# Altium footprint library TYCO THD.PcbLib: 146 footprints (part 9 of 11) (continued)
## TYCO_2007456-1 [mm] "SFP+ 1x4 Press Fit Cage"
height 8.8
pads (23):
  rect 2.8x1.75 hole 1.05: 1(-18.09,28.5) 2(-9.09,28.5) 3(-0.09,28.5) 4(8.91,28.5) 5(19.61,28.5) 6(-22.59,9.5) 7(-13.59,9.5) 8(-4.59,9.5) 9(4.41,9.5) 10(15.11,9.5) 13(-18.09,-9.5) 14(-9.09,-9.5) 15(-0.09,-9.5) 16(8.91,-9.5) 17(19.61,-9.5) 19(-22.59,-28.5) 20(-13.59,-28.5) 21(-4.59,-28.5) 22(4.41,-28.5) 23(15.11,-28.5)
  rect 1.75x2.8 hole 1.05: 11(22.59,11.12) 12(22.59,-7.88) 18(22.59,-26.38)
Top Overlay:
  lines w0.2: -28.79,-29.999 -28.79,-5.6 -27.65,-5.295 -27.65,-3.405 -28.79,-3.1 -28.79,3.1 -27.65,3.405 -27.65,5.295 -28.79,5.6 -28.79,30 ; -28.79,-28.675 -26.565,-28.675 -26.565,-28.625 ; -28.79,-28.629 -23.99,-28.628 ; -28.79,-22.1 -28.79,-15.9 ; -28.79,28.625 -19.49,28.624 ; -28.79,28.675 -26.565,28.675 -26.565,28.625 ; -27.65,-28.675 -27.65,-30 -30.79,-30 -30.79,30 -27.65,30 -27.65,28.675 ; -24.49,28.625 -24.49,28.875 -19.99,28.875 -19.99,28.625 ; -21.19,-28.628 -14.99,-28.628 ; -20.64,-28.625 -20.64,-28.875 -15.54,-28.875 -15.54,-28.625 ; -16.69,28.624 -10.49,28.624 ; -15.44,28.625 -15.44,29.094 -11.74,29.094 -11.74,28.625 ; -12.19,-28.627 -5.99,-28.627 ; -10.94,-28.627 -10.94,-29.094 -7.24,-29.094 -7.24,-28.626 ; -7.69,28.623 -1.49,28.623 ; -6.44,28.625 -6.44,29.094 -2.74,29.094 -2.74,28.625 ; -3.19,-28.627 3.01,-28.626 ; -1.94,-28.627 -1.94,-29.094 1.76,-29.094 1.76,-28.626 ; 1.31,28.623 7.51,28.622 ; 1.86,28.625 1.86,28.875 6.96,28.875 6.96,28.625 ; 5.81,-28.626 13.71,-28.626 ; 6.31,-28.625 6.31,-28.875 8.41,-28.875 8.41,-28.625 ; 10.31,28.622 18.21,28.621 ; 16.51,-28.625 21.96,-28.625 21.96,-27.78 ; 18.21,28.675 17.91,28.675 17.91,28.925 18.21,28.925 ; 21.01,28.621 21.96,28.621 21.96,27.375 22.96,27.375 22.96,12.52 ; 21.01,28.675 21.96,28.675 cw(c21.96,28.175) 22.46,28.175 22.46,27.925 ; 21.01,28.925 21.96,28.925 cw(c21.96,28.175) 22.71,28.175 22.71,27.375 ; 21.96,-27.925 22.71,-27.925 ; 21.96,27.925 22.71,27.925 ; 22.46,-27.925 22.46,-28.175 cw(c21.96,-28.175) 21.96,-28.675 17.91,-28.675 17.91,-28.925 21.96,-28.925 ccw(c21.96,-28.175) 22.71,-28.175 22.71,-27.78 ; 22.71,-9.584 ccw(c22.506,-9.123) 22.985,-9.28 ; 22.71,-9.28 22.71,-10.625 22.96,-10.625 22.96,-24.98 ; 22.71,9.416 ccw(c22.506,9.877) 22.985,9.72 ; 22.71,9.72 22.71,8.375 22.96,8.375 22.96,-6.48 ; 22.96,-20.35 23.16,-20.35 23.16,-17.65 22.96,-17.65 ; 22.96,-1.35 23.16,-1.35 23.16,1.35 22.96,1.35 ; 22.96,17.65 23.16,17.65 23.16,20.35 22.96,20.35
Mechanical 8:
  drawing of 1062 lines, arcs and shapes, not listed
Mechanical 14:
  drawing of 885 lines, arcs and shapes, not listed
Drill Drawing:
  lines w0.1: -24.445,1.725 -24.445,22.37 -19.24,27.575 ; -27.65,-29.999 -27.65,30 23.16,30 23.16,-29.999 -27.65,-29.999
  text "PRESS-FIT TECHNOLOGY" at -26.255,3.6 h1
  text "23x diam. 1.05mm +/-0.05" at -24.87,1.625 h1
3D body "TYCO_2007456-1.stp": height 13.25, standoff -2.05, extent -30.79,-30 23.16,30

## TYCO_5103310-5 [mm] "20 Contacts - Right Angle Double-Row .100'' x .100'' Low Profile Four-Wall Header, AMP-LATCH Serie"
height 9.14
pads (20):
  round 1.7 hole 1: 1(-11.43,-1.27) 2(-11.43,1.27) 3(-8.89,-1.27) 4(-8.89,1.27) 5(-6.35,-1.27) 6(-6.35,1.27) 7(-3.81,-1.27) 8(-3.81,1.27) 9(-1.27,-1.27) 10(-1.27,1.27) 11(1.27,-1.27) 12(1.27,1.27) 13(3.81,-1.27) 14(3.81,1.27) 15(6.35,-1.27) 16(6.35,1.27) 17(8.89,-1.27) 18(8.89,1.27) 19(11.43,-1.27) 20(11.43,1.27)
Top Overlay:
  circle w0.3: c-13.2,-1.27 r0.15
  lines w0.2: -13.97,2.057 -12.7,4.257 -11.656,2.449 ; -12.336,2.057 -15.367,2.057 -15.367,1.016 -16.51,1.016 -16.51,10.871 16.51,10.871 16.51,1.016 15.367,1.016 15.367,2.057 12.336,2.057 ; -2.604,10.871 cw(c-2.604,10.363) -2.096,10.363 -2.095,4.14 ccw(c-1.333,4.14) -1.333,3.378 1.333,3.378 ccw(c1.333,4.14) 2.095,4.17 2.095,10.363 cw(c2.604,10.363) 2.604,10.871 ; -2.095,4.394 2.095,4.394 ; -1.581,4.394 -1.581,10.49 -0.959,10.49 -0.959,4.394 ; 0.959,4.394 0.959,10.49 1.581,10.49 1.581,4.394
  text "20" at 12.915,0.207 h1.2
Mechanical 8:
  lines w0.1: -11.93,-1.27 -11.43,-1.27 ; -11.93,1.27 -11.43,1.27 ; -11.43,-1.77 -11.43,-1.27 ; -11.43,-0.77 -11.43,-1.27 ; -11.43,0.77 -11.43,1.27 ; -11.43,1.77 -11.43,1.27 ; -10.93,-1.27 -11.43,-1.27 ; -10.93,1.27 -11.43,1.27 ; -9.39,-1.27 -8.89,-1.27 ; -9.39,1.27 -8.89,1.27 ; -8.89,-1.77 -8.89,-1.27 ; -8.89,-0.77 -8.89,-1.27 ; -8.89,0.77 -8.89,1.27 ; -8.89,1.77 -8.89,1.27 ; -8.39,-1.27 -8.89,-1.27 ; -8.39,1.27 -8.89,1.27 ; -6.85,-1.27 -6.35,-1.27 ; -6.85,1.27 -6.35,1.27 ; -6.35,-1.77 -6.35,-1.27 ; -6.35,-0.77 -6.35,-1.27 ; -6.35,0.77 -6.35,1.27 ; -6.35,1.77 -6.35,1.27 ; -5.85,-1.27 -6.35,-1.27 ; -5.85,1.27 -6.35,1.27 ; -4.31,-1.27 -3.81,-1.27 ; -4.31,1.27 -3.81,1.27 ; -3.81,-1.77 -3.81,-1.27 ; -3.81,-0.77 -3.81,-1.27 ; -3.81,0.77 -3.81,1.27 ; -3.81,1.77 -3.81,1.27 ; -3.31,-1.27 -3.81,-1.27 ; -3.31,1.27 -3.81,1.27 ; -1.77,-1.27 -1.27,-1.27 ; -1.77,1.27 -1.27,1.27 ; -1.27,-1.77 -1.27,-1.27 ; -1.27,-0.77 -1.27,-1.27 ; -1.27,0.77 -1.27,1.27 ; -1.27,1.77 -1.27,1.27 ; -0.77,-1.27 -1.27,-1.27 ; -0.77,1.27 -1.27,1.27 ; -0.5,0 0,0 ; 0,-0.5 0,0 ; 0,0.5 0,0 ; 0.5,0 0,0 ; 0.77,-1.27 1.27,-1.27 ; 0.77,1.27 1.27,1.27 ; 1.27,-1.77 1.27,-1.27 ; 1.27,-0.77 1.27,-1.27 ; 1.27,0.77 1.27,1.27 ; 1.27,1.77 1.27,1.27 ; 1.77,-1.27 1.27,-1.27 ; 1.77,1.27 1.27,1.27 ; 3.31,-1.27 3.81,-1.27 ; 3.31,1.27 3.81,1.27 ; 3.81,-1.77 3.81,-1.27 ; 3.81,-0.77 3.81,-1.27 ; 3.81,0.77 3.81,1.27 ; 3.81,1.77 3.81,1.27 ; 4.31,-1.27 3.81,-1.27 ; 4.31,1.27 3.81,1.27 ; 5.85,-1.27 6.35,-1.27 ; 5.85,1.27 6.35,1.27 ; 6.35,-1.77 6.35,-1.27 ; 6.35,-0.77 6.35,-1.27 ; 6.35,0.77 6.35,1.27 ; 6.35,1.77 6.35,1.27 ; 6.85,-1.27 6.35,-1.27 ; 6.85,1.27 6.35,1.27 ; 8.39,-1.27 8.89,-1.27 ; 8.39,1.27 8.89,1.27 ; 8.89,-1.77 8.89,-1.27 ; 8.89,-0.77 8.89,-1.27 ; 8.89,0.77 8.89,1.27 ; 8.89,1.77 8.89,1.27 ; 9.39,-1.27 8.89,-1.27 ; 9.39,1.27 8.89,1.27 ; 10.93,-1.27 11.43,-1.27 ; 10.93,1.27 11.43,1.27 ; 11.43,-1.77 11.43,-1.27 ; 11.43,-0.77 11.43,-1.27 ; 11.43,0.77 11.43,1.27 ; 11.43,1.77 11.43,1.27 ; 11.93,-1.27 11.43,-1.27 ; 11.93,1.27 11.43,1.27
Mechanical 14:
  circle w0.3: c-13.2,-1.27 r0.15
  lines w0.1: -13.97,2.057 -12.7,4.257 -11.43,2.057 ; -11.938,2.057 -11.938,1.676 -11.741,1.676 ; -11.741,2.057 -11.741,-1.581 -11.119,-1.581 -11.119,2.057 ; -11.119,1.676 -10.922,1.676 -10.922,2.057 ; -9.398,2.057 -9.398,1.676 -9.201,1.676 ; -9.201,2.057 -9.201,-1.581 -8.579,-1.581 -8.579,2.057 ; -8.579,1.676 -8.382,1.676 -8.382,2.057 ; -6.858,2.057 -6.858,1.676 -6.661,1.676 ; -6.661,2.057 -6.661,-1.581 -6.039,-1.581 -6.039,2.057 ; -6.039,1.676 -5.842,1.676 -5.842,2.057 ; -4.318,2.057 -4.318,1.676 -4.121,1.676 ; -4.121,2.057 -4.121,-1.581 -3.499,-1.581 -3.499,2.057 ; -3.499,1.676 -3.302,1.676 -3.302,2.057 ; -2.604,10.871 cw(c-2.604,10.363) -2.096,10.363 -2.095,4.14 ccw(c-1.333,4.14) -1.333,3.378 1.333,3.378 ccw(c1.333,4.14) 2.095,4.17 2.095,10.363 cw(c2.604,10.363) 2.604,10.871 ; -2.095,4.394 2.095,4.394 ; -1.778,2.057 -1.778,1.676 -1.581,1.676 ; -1.581,2.057 -1.581,-1.581 -0.959,-1.581 -0.959,2.057 ; -1.581,4.394 -1.581,10.49 -0.959,10.49 -0.959,4.394 ; -0.959,1.676 -0.762,1.676 -0.762,2.057 ; 0.762,2.057 0.762,1.676 0.959,1.676 ; 0.959,2.057 0.959,-1.581 1.581,-1.581 1.581,2.057 ; 0.959,4.394 0.959,10.49 1.581,10.49 1.581,4.394 ; 1.581,1.676 1.778,1.676 1.778,2.057 ; 3.302,2.057 3.302,1.676 3.499,1.676 ; 3.499,2.057 3.499,-1.581 4.121,-1.581 4.121,2.057 ; 4.121,1.676 4.318,1.676 4.318,2.057 ; 5.842,2.057 5.842,1.676 6.039,1.676 ; 6.039,2.057 6.039,-1.581 6.661,-1.581 6.661,2.057 ; 6.661,1.676 6.858,1.676 6.858,2.057 ; 8.382,2.057 8.382,1.676 8.579,1.676 ; 8.579,2.057 8.579,-1.581 9.201,-1.581 9.201,2.057 ; 9.201,1.676 9.398,1.676 9.398,2.057 ; 10.922,2.057 10.922,1.676 11.119,1.676 ; 11.119,2.057 11.119,-1.581 11.741,-1.581 11.741,2.057 ; 11.741,1.676 11.938,1.676 11.938,2.057 ; -16.51,1.016 -15.367,1.016 -15.367,2.057 15.367,2.057 15.367,1.016 16.51,1.016 16.51,10.871 -16.51,10.871 -16.51,1.016
  text "20" at 12.915,0.207 h1.2
3D body "TYCO_5103310-5.stp": height 9.14, standoff -3.43, extent -16.51,-1.581 16.51,10.871

## TYCO_5120913-1 [mm] "Universal Right Angle Female Power Module Guide (keyed)"
height 9.78
pads (4):
  round 5.2 hole 2.9: 1(-7.5,0) 1(0,0)
  rect 22.8x8.3 smd paste-4.15 mask-4.15: 1(1.25,0)
  round 3.9 hole 3.2: 1(7.5,0)
Top Overlay:
  lines w0.2: 13.05,-3.95 24.25,-3.95 24.25,3.95 13.05,3.95 ; 13.05,-3.25 24.25,-3.25 ; 13.05,3.25 24.25,3.25
Mechanical 8:
  circle w0.1: c0,0 r1.45
  circle w0.1: c7.5,0 r1.6
  circle w0.1: c-7.5,0 r1.45
  lines w0.1: -8,0 -7.5,0 ; -7.5,-0.5 -7.5,0 ; -7.5,0.5 -7.5,0 ; -7,0 -7.5,0 ; -0.5,0 0,0 ; 0,-0.5 0,0 ; 0,0.5 0,0 ; 0.5,0 0,0 ; 7,0 7.5,0 ; 7.5,-0.5 7.5,0 ; 7.5,0.5 7.5,0 ; 8,0 7.5,0 ; 13.25,-3.95 13.25,0 13.25,3.95
  text "PCB Edge" at 14.615,-3.5 h1
Mechanical 14:
  lines w0.1: 11.75,-3.95 11.75,-3.25 24.25,-3.25 ; 11.75,3.95 11.75,3.25 24.25,3.25 ; -9.95,-3.95 24.25,-3.95 24.25,3.95 -9.95,3.95 -9.95,-3.95
3D body "TYCO_5120913-1.stp": height 9.7, standoff -2, extent -9.95,-3.95 24.25,3.95

## TYCO_5227673-1 [mm] "50 Ohms , BNC Vertical Socket"
height 36.23
pads (4):
  round 1.6 hole 0.9: 1(0,0) 2(-2.54,0)
  round 2.8 hole 2.1: 3(-5.08,-5.08) 3(5.08,5.08)
Top Overlay:
  circle w0.2: c0,0 r4.064
  lines w0.2: -7.379,-2.825 -7.379,-6.604 ccw(c-6.363,-6.604) -6.363,-7.62 -1.949,-7.62 ; -7.379,2.905 -7.379,6.604 cw(c-6.363,6.604) -6.363,7.62 ; -7,-3.653 cw(c-0.017,0.04) -7,3.734 ; -6.737,4.193 cw(c-0.017,0.04) -0.253,7.937 ; -6.712,-4.208 -7,-4.041 -7,4.041 0,8.083 3.509,6.057 ccw(c0,0) -6.057,-3.509 ; -4.161,-6.686 ccw(c-0.017,0.04) -0.403,-7.85 ; -3.492,7.62 -3.492,8.255 -6.858,8.255 -6.858,7.62 -6.363,7.62 ; -2.243,7.62 -6.363,7.62 ; -2.061,-1.1 ccw(c0,0) -2.061,1.1 ; -0.991,-4.723 -0.991,-5.537 0.984,-5.537 0.991,-4.723 ; -0.991,4.723 -0.991,5.486 0.991,5.486 0.991,4.723 ; 0.255,7.935 cw(c-0.017,0.04) 4.212,6.713 ; 0.406,-7.849 ccw(c-0.017,0.04) 6.604,-4.27 ; 1.915,-7.62 6.363,-7.62 ccw(c6.363,-6.604) 7.379,-6.604 7.379,-2.738 ; 2.209,7.62 6.363,7.62 cw(c6.363,6.604) 7.379,6.604 7.379,2.818 ; 3.302,7.62 3.302,8.255 6.858,8.255 6.858,7.491 ; 6.057,3.509 cw(c0,0) -3.509,-6.057 0,-8.083 7,-4.041 7,4.041 6.712,4.208 ; 7,-3.59 ccw(c-0.017,0.04) 7,3.67 ; 4.712,-1.044 cw(c0,0) 4.712,1.044 4.712,-1.044
Mechanical 8:
  lines w0.1: -5.58,-5.08 -5.08,-5.08 ; -5.08,-5.58 -5.08,-5.08 ; -5.08,-4.58 -5.08,-5.08 ; -4.58,-5.08 -5.08,-5.08 ; -3.04,0 -2.54,0 ; -2.54,-0.5 -2.54,0 ; -2.54,0.5 -2.54,0 ; -2.04,0 -2.54,0 ; -0.5,0 0,0 ; 0,-0.5 0,0 ; 0,0.5 0,0 ; 0.5,0 0,0 ; 4.58,5.08 5.08,5.08 ; 5.08,4.58 5.08,5.08 ; 5.08,5.58 5.08,5.08 ; 5.58,5.08 5.08,5.08
Mechanical 14:
  circle w0.1: c0,0 r7
  circle w0.1: c0,0 r4.064
  circle w0.1: c0,0 r1.041
  circle w0.1: c0,0 r0.508
  circle w0.1: c0,0 r2.337
  lines w0.1: -7.379,-2.825 -7.379,-6.604 ccw(c-6.363,-6.604) -6.363,-7.62 -1.949,-7.62 ; -7.379,2.905 -7.379,6.604 cw(c-6.363,6.604) -6.363,7.62 ; -7,-3.653 cw(c-0.017,0.04) -7,3.734 ; -6.737,4.193 cw(c-0.017,0.04) -0.253,7.937 ; -6.657,-4.239 ccw(c-0.017,0.04) -0.403,-7.85 ; -3.492,7.62 -3.492,8.255 -6.858,8.255 -6.858,7.62 -6.363,7.62 ; -2.243,7.62 -6.363,7.62 ; -0.991,-4.723 -0.991,-5.537 0.984,-5.537 0.991,-4.723 ; -0.991,4.723 -0.991,5.486 0.991,5.486 0.991,4.723 ; 0.255,7.935 cw(c-0.017,0.04) 6.685,4.223 ; 0.406,-7.849 ccw(c-0.017,0.04) 6.604,-4.27 ; 1.915,-7.62 6.363,-7.62 ccw(c6.363,-6.604) 7.379,-6.604 7.379,-2.738 ; 2.209,7.62 6.363,7.62 cw(c6.363,6.604) 7.379,6.604 7.379,2.818 ; 3.302,7.62 3.302,8.255 6.858,8.255 6.858,7.491 ; 7,-3.59 ccw(c-0.017,0.04) 7,3.67 ; -7,-4.041 -7,4.041 0,8.083 7,4.041 7,-4.041 0,-8.083 -7,-4.041 ; 4.712,-1.044 cw(c0,0) 4.712,1.044 4.712,-1.044
3D body "TYCO_5227673-1_Part3.stp": height 19.93, standoff 19.16, extent -7.916,-7.86 7.883,7.94
3D body "TYCO_5227673-1_Part2.stp": height 22.43, standoff 19.93, extent -7,-8.083 7,8.083
3D body "TYCO_5227673-1_Part1.stp": height 35.56, standoff -5.71, extent -7.379,-7.62 7.379,8.255

## TYCO_5352406-1 [mm] "Z-Pack, HM Type B19, 95 Contacts (abcde), Pitch 2mm, Male Right Angled Connector"
height 7.3
pads (95):
  round 1.1 hole 0.6: a1(0,0) a2(0,-2) a3(0,-4) a4(0,-6) a5(0,-8) a6(0,-10) a7(0,-12) a8(0,-14) a9(0,-16) a10(0,-18) a11(0,-20) a12(0,-22) a13(0,-24) a14(0,-26) a15(0,-28) a16(0,-30) a17(0,-32) a18(0,-34) a19(0,-36) b1(2,0) b2(2,-2) b3(2,-4) b4(2,-6) b5(2,-8) b6(2,-10) b7(2,-12) b8(2,-14) b9(2,-16) b10(2,-18) b11(2,-20) b12(2,-22) b13(2,-24) b14(2,-26) b15(2,-28) b16(2,-30) b17(2,-32) b18(2,-34) b19(2,-36) c1(4,0) c2(4,-2) c3(4,-4) c4(4,-6) c5(4,-8) c6(4,-10) c7(4,-12) c8(4,-14) c9(4,-16) c10(4,-18) c11(4,-20) c12(4,-22) c13(4,-24) c14(4,-26) c15(4,-28) c16(4,-30) c17(4,-32) c18(4,-34) c19(4,-36) d1(6,0) d2(6,-2) d3(6,-4) d4(6,-6) d5(6,-8) d6(6,-10) d7(6,-12) d8(6,-14) d9(6,-16) d10(6,-18) d11(6,-20) d12(6,-22) d13(6,-24) d14(6,-26) d15(6,-28) d16(6,-30) d17(6,-32) d18(6,-34) d19(6,-36) e1(8,0) e2(8,-2) e3(8,-4) e4(8,-6) e5(8,-8) e6(8,-10) e7(8,-12) e8(8,-14) e9(8,-16) e10(8,-18) e11(8,-20) e12(8,-22) e13(8,-24) e14(8,-26) e15(8,-28) e16(8,-30) e17(8,-32) e18(8,-34) e19(8,-36)
Top Overlay:
  lines w0.2: -2,-36.9 8.988,-36.9 9.4,-36.75 9.4,0.9 8.988,1.05 -2,1.05 -2,-36.95 -17.35,-36.95 -17.35,0.95 -2,0.95
  text "a" at -0.333,1.667 h1.2
  text "b" at 1.667,1.5 h1.2
  text "c" at 3.667,1.667 h1.2
  text "d" at 5.667,1.5 h1.2
  text "1" at -2.86,-0.8 h1.2
  text "19" at -4.16,-36.5 h1.2
  text "e" at 7.667,1.667 h1.2
Mechanical 8:
  lines w0.05: -1.5,-38.044 -1.5,2 ; -0.5,-36 0,-36 ; -0.5,-34 0,-34 ; -0.5,-2 0,-2 ; -0.5,0 0,0 ; 0,-36.5 0,-36 ; 0,-35.5 0,-36 ; 0,-34.5 0,-34 ; 0,-33.5 0,-34 ; 0,-2.5 0,-2 ; 0,-1.5 0,-2 ; 0,-0.5 0,0 ; 0,0.5 0,0 ; 0.5,-36 0,-36 ; 0.5,-34 0,-34 ; 0.5,-2 0,-2 ; 0.5,0 0,0 ; 1.5,-36 2,-36 ; 1.5,-34 2,-34 ; 1.5,-2 2,-2 ; 1.5,0 2,0 ; 2,-36.5 2,-36 ; 2,-35.5 2,-36 ; 2,-34.5 2,-34 ; 2,-33.5 2,-34 ; 2,-2.5 2,-2 ; 2,-1.5 2,-2 ; 2,-0.5 2,0 ; 2,0.5 2,0 ; 2.5,-36 2,-36 ; 2.5,-34 2,-34 ; 2.5,-2 2,-2 ; 2.5,0 2,0 ; 3.5,-36 4,-36 ; 3.5,-34 4,-34 ; 3.5,-2 4,-2 ; 3.5,0 4,0 ; 4,-36.5 4,-36 ; 4,-35.5 4,-36 ; 4,-34.5 4,-34 ; 4,-33.5 4,-34 ; 4,-2.5 4,-2 ; 4,-1.5 4,-2 ; 4,-0.5 4,0 ; 4,0.5 4,0 ; 4.5,-36 4,-36 ; 4.5,-34 4,-34 ; 4.5,-2 4,-2 ; 4.5,0 4,0 ; 5.5,-36 6,-36 ; 5.5,-34 6,-34 ; 5.5,-2 6,-2 ; 5.5,0 6,0 ; 6,-36.5 6,-36 ; 6,-35.5 6,-36 ; 6,-34.5 6,-34 ; 6,-33.5 6,-34 ; 6,-2.5 6,-2 ; 6,-1.5 6,-2 ; 6,-0.5 6,0 ; 6,0.5 6,0 ; 6.5,-36 6,-36 ; 6.5,-34 6,-34 ; 6.5,-2 6,-2 ; 6.5,0 6,0 ; 7.5,-36 8,-36 ; 7.5,-34 8,-34 ; 7.5,-2 8,-2 ; 7.5,0 8,0 ; 8,-36.5 8,-36 ; 8,-35.5 8,-36 ; 8,-34.5 8,-34 ; 8,-33.5 8,-34 ; 8,-2.5 8,-2 ; 8,-1.5 8,-2 ; 8,-0.5 8,0 ; 8,0.5 8,0 ; 8.5,-36 8,-36 ; 8.5,-34 8,-34 ; 8.5,-2 8,-2 ; 8.5,0 8,0
Mechanical 14:
  circle w0.1: c6,-2 r0.3
  circle w0.1: c8,-36 r0.3
  circle w0.1: c8,0 r0.3
  circle w0.1: c6,-36 r0.3
  circle w0.1: c6,0 r0.3
  circle w0.1: c4,-36 r0.3
  circle w0.1: c4,0 r0.3
  circle w0.1: c2,-36 r0.3
  circle w0.1: c2,0 r0.3
  circle w0.1: c8,-34 r0.3
  circle w0.1: c4,-34 r0.3
  circle w0.1: c2,-34 r0.3
  circle w0.1: c6,-34 r0.3
  circle w0.1: c0,-36 r0.3
  circle w0.1: c8,-2 r0.3
  circle w0.1: c0,-34 r0.3
  circle w0.1: c4,-2 r0.3
  circle w0.1: c0,-2 r0.3
  circle w0.1: c2,-2 r0.3
  circle w0.1: c0,0 r0.3
  lines w0.1: -2,-36.9 8.988,-36.9 9.4,-36.75 9.4,0.9 8.988,1.05 -2,1.05 -2,-36.95 -17.35,-36.95 -17.35,0.95 -2,0.95
  text "1" at -2.86,-0.8 h1.2
  text "d" at 5.667,1.5 h1.2
  text "c" at 3.667,1.667 h1.2
  text "b" at 1.667,1.5 h1.2
  text "a" at -0.333,1.667 h1.2
  text "19" at -4.16,-36.5 h1.2
  text "e" at 7.667,1.667 h1.2
Drill Drawing:
  lines w0.1: -1,-37 -1,1 ; 9,-37 9,1
  text "PRESS-FIT TECHNOLOGY diam. 0.6mm +/- 0.05" at 11,-34.9 h1
3D body "TYCO_5352406-1.stp": height 9.6, standoff -5.75, extent -17.35,-36.95 9.4,1.05

## TYCO_5406203-3 [mm] "4 x RJ45 Jacks - 8 Positions"
height 13.64
pads (39):
  round 1.6 hole 0.9: 1A(-16.51,1.27) 1B(-2.54,1.27) 1C(11.43,1.27) 1D(25.4,1.27) 2A(-17.78,-1.27) 2B(-3.81,-1.27) 2C(10.16,-1.27) 2D(24.13,-1.27) 3A(-19.05,1.27) 3B(-5.08,1.27) 3C(8.89,1.27) 3D(22.86,1.27) 4A(-20.32,-1.27) 4B(-6.35,-1.27) 4C(7.62,-1.27) 4D(21.59,-1.27) 5A(-21.59,1.27) 5B(-7.62,1.27) 5C(6.35,1.27) 5D(20.32,1.27) 6A(-22.86,-1.27) 6B(-8.89,-1.27) 6C(5.08,-1.27) 6D(19.05,-1.27) 7A(-24.13,1.27) 7B(-10.16,1.27) 7C(3.81,1.27) 7D(17.78,1.27) 8A(-25.4,-1.27) 8B(-11.43,-1.27) 8C(2.54,-1.27) 8D(16.51,-1.27)
  round 0.5 hole 3.2 unplated mask+1.35: M1(26.67,7.62) M2(-26.67,7.62)
  round 2.3 hole 1.6: SH(-29.46,12.19) SH(-13.97,-2.792) SH(0,-2.792) SH(13.97,-2.792) SH(29.46,12.19)
Top Overlay:
  lines w0.2: -30.12,13.402 -30.505,15.499 -30.505,16.896 cw(c-29.845,16.946) -30.183,17.516 -29.591,17.93 ; -29.894,13.548 -30.256,15.499 -30.256,16.896 cw(c-29.757,16.9) -30.04,17.312 -29.591,17.626 ; -29.591,10.7 -29.591,0.894 -29.274,0.645 -29.274,0.513 -29.459,0.513 -29.459,-2.916 -15.4,-2.916 ; -29.591,13.616 -29.591,18.42 29.591,18.42 29.591,13.616 ; -29.459,-1.039 -29.68,-0.625 -29.68,-0.117 -29.459,-0.117 ; -29.21,-2.916 -29.21,0.513 ; -25.349,18.42 -25.349,10.165 -24.841,10.165 -24.841,18.014 -22.301,18.014 -22.301,10.165 -21.793,10.165 -21.793,18.42 ; -20.142,18.42 -20.142,10.165 -19.634,10.165 -19.634,18.014 -17.094,18.014 -17.094,10.165 -16.586,10.165 -16.586,18.42 ; -12.5,-2.916 -1.4,-2.916 ; -11.379,18.42 -11.379,10.165 -10.871,10.165 -10.871,18.014 -8.331,18.014 -8.331,10.165 -7.823,10.165 -7.823,18.42 ; -6.172,18.42 -6.172,10.165 -5.664,10.165 -5.664,18.014 -3.124,18.014 -3.124,10.165 -2.616,10.165 -2.616,18.42 ; 1.4,-2.916 12.6,-2.916 ; 2.592,18.42 2.592,10.165 3.1,10.165 3.1,18.014 5.64,18.014 5.64,10.165 6.148,10.165 6.148,18.42 ; 7.799,18.42 7.799,10.165 8.307,10.165 8.307,18.014 10.847,18.014 10.847,10.165 11.355,10.165 11.355,18.42 ; 15.4,-2.916 29.459,-2.916 29.459,0.513 29.274,0.513 29.274,0.645 29.591,0.894 29.591,10.7 ; 16.562,18.42 16.562,10.165 17.07,10.165 17.07,18.014 19.61,18.014 19.61,10.165 20.118,10.165 20.118,18.42 ; 21.769,18.42 21.769,10.165 22.277,10.165 22.277,18.014 24.817,18.014 24.817,10.165 25.325,10.165 25.325,18.42 ; 29.21,-2.916 29.21,0.513 ; 29.459,-1.039 29.68,-0.625 29.68,-0.117 29.459,-0.117 ; 29.591,17.626 30.04,17.312 cw(c29.757,16.9) 30.256,16.896 30.256,15.499 29.894,13.548 ; 29.591,17.93 30.183,17.516 cw(c29.845,16.946) 30.505,16.896 30.505,15.499 30.12,13.402
Mechanical 8:
  drawing of 156 lines, arcs and shapes, not listed
Mechanical 14:
  lines w0.1: -29.591,10.526 -30.505,15.499 -30.505,16.896 cw(c-29.845,16.946) -30.183,17.516 -29.591,17.93 ; -29.591,11.914 -30.256,15.499 -30.256,16.896 cw(c-29.757,16.9) -30.04,17.312 -29.591,17.626 ; -29.459,-1.039 -29.68,-0.625 -29.68,-0.117 -29.459,-0.117 ; -29.21,-2.916 -29.21,0.513 29.21,0.513 29.21,-2.916 ; -25.349,18.42 -25.349,10.165 -24.841,10.165 -24.841,18.014 -22.301,18.014 -22.301,10.165 -21.793,10.165 -21.793,18.42 ; -20.142,18.42 -20.142,10.165 -19.634,10.165 -19.634,18.014 -17.094,18.014 -17.094,10.165 -16.586,10.165 -16.586,18.42 ; -11.379,18.42 -11.379,10.165 -10.871,10.165 -10.871,18.014 -8.331,18.014 -8.331,10.165 -7.823,10.165 -7.823,18.42 ; -6.172,18.42 -6.172,10.165 -5.664,10.165 -5.664,18.014 -3.124,18.014 -3.124,10.165 -2.616,10.165 -2.616,18.42 ; 2.592,18.42 2.592,10.165 3.1,10.165 3.1,18.014 5.64,18.014 5.64,10.165 6.148,10.165 6.148,18.42 ; 7.799,18.42 7.799,10.165 8.307,10.165 8.307,18.014 10.847,18.014 10.847,10.165 11.355,10.165 11.355,18.42 ; 16.562,18.42 16.562,10.165 17.07,10.165 17.07,18.014 19.61,18.014 19.61,10.165 20.118,10.165 20.118,18.42 ; 21.769,18.42 21.769,10.165 22.277,10.165 22.277,18.014 24.817,18.014 24.817,10.165 25.325,10.165 25.325,18.42 ; 29.459,-1.039 29.68,-0.625 29.68,-0.117 29.459,-0.117 ; 29.591,10.526 30.505,15.499 30.505,16.896 ccw(c29.845,16.946) 30.183,17.516 29.591,17.93 ; 29.591,11.914 30.256,15.499 30.256,16.896 ccw(c29.757,16.9) 30.04,17.312 29.591,17.626 ; -29.591,0.894 29.591,0.894 ; -29.591,0.894 -29.591,18.42 29.591,18.42 29.591,0.894 ; -29.591,0.894 -29.274,0.645 ; -29.274,0.645 29.274,0.645 ; -29.274,0.645 -29.274,0.513 -29.459,0.513 -29.459,-2.916 29.459,-2.916 29.459,0.513 29.274,0.513 29.274,0.645 ; 29.274,0.645 29.591,0.894
Mechanical 15:
  lines w0.1: -0.25,0 0,0 ; 0,-0.25 0,0 ; 0,0.25 0,0 ; 0.25,0 0,0
3D body "TYCO_5406203-3.stp": height 14.55, standoff -3.94, extent -30.505,-2.916 30.505,18.42

## TYCO_5530843-5 [mm] "50 Contacts, Pitch 2.54, 2rows,  Surface Mount Straight Receptacle, SEC-II Series"
height 15.5
pads (50):
  round 2 hole 1.3: 1(-30.48,-2.426) 2(-30.48,2.426) 3(-27.94,-2.426) 4(-27.94,2.426) 5(-25.4,-2.426) 6(-25.4,2.426) 7(-22.86,-2.426) 8(-22.86,2.426) 9(-20.32,-2.426) 10(-20.32,2.426) 11(-17.78,-2.426) 12(-17.78,2.426) 13(-15.24,-2.426) 14(-15.24,2.426) 15(-12.7,-2.426) 16(-12.7,2.426) 17(-10.16,-2.426) 18(-10.16,2.426) 19(-7.62,-2.426) 20(-7.62,2.426) 21(-5.08,-2.426) 22(-5.08,2.426) 23(-2.54,-2.426) 24(-2.54,2.426) 25(0,-2.426) 26(0,2.426) 27(2.54,-2.426) 28(2.54,2.426) 29(5.08,-2.426) 30(5.08,2.426) 31(7.62,-2.426) 32(7.62,2.426) 33(10.16,-2.426) 34(10.16,2.426) 35(12.7,-2.426) 36(12.7,2.426) 37(15.24,-2.426) 38(15.24,2.426) 39(17.78,-2.426) 40(17.78,2.426) 41(20.32,-2.426) 42(20.32,2.426) 43(22.86,-2.426) 44(22.86,2.426) 45(25.4,-2.426) 46(25.4,2.426) 47(27.94,-2.426) 48(27.94,2.426) 49(30.48,-2.426) 50(30.48,2.426)
Top Overlay:
  drawing of 174 lines, arcs and shapes, not listed
  text "1" at -32.5,-4.1 h1.2
  text "49" at 32,-4.1 h1.2
Mechanical 8:
  drawing of 204 lines, arcs and shapes, not listed
Mechanical 14:
  drawing of 173 lines, arcs and shapes, not listed
  text "1" at -32.5,-4.1 h1.2
  text "49" at 32,-4.1 h1.2
3D body "TYCO_5530843-5.stp": height 15.49, standoff -3.17, extent -35.052,-4.673 35.052,4.674

## TYCO_5555165-1 [mm] "1 Port RJ12 Connector, 6P6C, Right Angle With Ears"
height 12.7
pads (8):
  round 1.6 hole 0.9: 1(3.175,-1.27) 2(1.905,1.27) 3(0.635,-1.27) 4(-0.635,1.27) 5(-1.905,-1.27) 6(-3.175,1.27)
  round 0.5 hole 3.3 unplated mask+1.4: M1(-5.08,7.62) M2(5.08,7.62)
Top Overlay:
  lines w0.2: -6.642,5.62 -6.642,-2.21 -3.055,-2.21 ; -6.642,9.62 -6.642,15.824 6.642,15.824 6.642,9.62 ; -0.755,-2.21 -0.515,-2.21 ; 1.785,-2.21 2.025,-2.21 ; 4.325,-2.21 6.642,-2.21 6.642,5.62
  text "1" at 3.145,-4.2 h1.2
Mechanical 8:
  circle w0.05: c-0.635,1.27 r0.45
  circle w0.05: c-0.635,1.27 r0.8
  circle w0.05: c0.635,-1.27 r0.45
  circle w0.05: c0.635,-1.27 r0.8
  circle w0.05: c-5.08,7.62 r1.65
  circle w0.05: c5.08,7.62 r1.65
  circle w0.05: c1.905,1.27 r0.45
  circle w0.05: c1.905,1.27 r0.8
  circle w0.05: c3.175,-1.27 r0.45
  circle w0.05: c3.175,-1.27 r0.8
  circle w0.05: c-3.175,1.27 r0.45
  circle w0.05: c-3.175,1.27 r0.8
  circle w0.05: c-1.905,-1.27 r0.45
  circle w0.05: c-1.905,-1.27 r0.8
  lines w0.05: -5.58,7.62 -5.08,7.62 ; -5.08,7.12 -5.08,7.62 ; -5.08,8.12 -5.08,7.62 ; -4.58,7.62 -5.08,7.62 ; -3.675,1.27 -3.175,1.27 ; -3.175,0.77 -3.175,1.27 ; -3.175,1.77 -3.175,1.27 ; -2.675,1.27 -3.175,1.27 ; -2.405,-1.27 -1.905,-1.27 ; -1.905,-1.77 -1.905,-1.27 ; -1.905,-0.77 -1.905,-1.27 ; -1.405,-1.27 -1.905,-1.27 ; -1.135,1.27 -0.635,1.27 ; -0.635,0.77 -0.635,1.27 ; -0.635,1.77 -0.635,1.27 ; -0.5,0 0,0 ; -0.135,1.27 -0.635,1.27 ; 0,-0.5 0,0 ; 0,0.5 0,0 ; 0.135,-1.27 0.635,-1.27 ; 0.5,0 0,0 ; 0.635,-1.77 0.635,-1.27 ; 0.635,-0.77 0.635,-1.27 ; 1.135,-1.27 0.635,-1.27 ; 1.405,1.27 1.905,1.27 ; 1.905,0.77 1.905,1.27 ; 1.905,1.77 1.905,1.27 ; 2.405,1.27 1.905,1.27 ; 2.675,-1.27 3.175,-1.27 ; 3.175,-1.77 3.175,-1.27 ; 3.175,-0.77 3.175,-1.27 ; 3.675,-1.27 3.175,-1.27 ; 4.58,7.62 5.08,7.62 ; 5.08,7.12 5.08,7.62 ; 5.08,8.12 5.08,7.62 ; 5.58,7.62 5.08,7.62
Mechanical 14:
  lines w0.1: -6.642,-2.21 -6.642,15.824 6.642,15.824 6.642,-2.21 -6.642,-2.21
  text "1" at 3.145,-4.2 h1.2
3D body "TYCO_5555165-1.stp": height 12.57, standoff -3.81, extent -6.642,-2.21 6.642,15.824

## TYCO_5569260-1 [mm] "2 x 2 Port RJ45 Jacks"
height 26.29
pads (40):
  round 1.6 hole 0.9: 1LL(-11.43,-4.568) 1LR(2.54,-4.568) 1UL(-2.54,4.572) 1UR(11.43,4.572) 2LL(-10.16,-2.028) 2LR(3.81,-2.028) 2UL(-3.81,2.032) 2UR(10.16,2.032) 3LL(-8.89,-4.568) 3LR(5.08,-4.568) 3UL(-5.08,4.572) 3UR(8.89,4.572) 4LL(-7.62,-2.028) 4LR(6.35,-2.028) 4UL(-6.35,2.032) 4UR(7.62,2.032) 5LL(-6.35,-4.568) 5LR(7.62,-4.568) 5UL(-7.62,4.572) 5UR(6.35,4.572) 6LL(-5.08,-2.028) 6LR(8.89,-2.028) 6UL(-8.89,2.032) 6UR(5.08,2.032) 7LL(-3.81,-4.568) 7LR(10.16,-4.568) 7UL(-10.16,4.572) 7UR(3.81,4.572) 8LL(-2.54,-2.028) 8LR(11.43,-2.028) 8UL(-11.43,2.032) 8UR(2.54,2.032)
  round 0.5 hole 3.3 unplated mask+1.4: M1(12.7,-10.918) M2(-12.7,-10.918)
  round 2.3 hole 1.6: SH(-15.49,-15.488) SH(-15.49,4.572) SH(-14.732,-1.778) SH(14.73,-5.078) SH(15.488,0.512) SH(15.49,-15.488)
Top Overlay:
  lines w0.2: -15.621,-21.39 -16.2,-21.12 cw(c-15.88,-20.434) -16.637,-20.434 -16.637,-19.68 cw(c-15.88,-19.68) -16.314,-19.06 -15.838,-18.726 ccw(c-16.129,-18.31) -15.621,-18.31 ; -15.621,-21.116 -16.095,-20.895 cw(c-15.88,-20.434) -16.388,-20.434 -16.388,-19.68 cw(c-15.88,-19.68) -16.171,-19.264 -15.695,-18.93 ccw(c-16.129,-18.31) -15.621,-18.871 ; -15.621,-17.133 -15.621,-21.712 15.621,-21.712 15.621,-17.133 ; -15.621,-13.843 -15.621,-3.168 ; -15.621,-0.388 -15.621,2.927 ; -15.621,6.217 -15.621,6.736 15.621,6.736 15.621,2.157 ; -1.714,-21.712 -1.714,-13.965 -1.27,-13.965 -1.27,-21.509 1.27,-21.509 1.27,-13.965 1.714,-13.965 1.714,-21.712 ; 15.621,-21.39 16.2,-21.12 ccw(c15.88,-20.434) 16.637,-20.434 16.637,-19.68 ccw(c15.88,-19.68) 16.314,-19.06 15.838,-18.726 cw(c16.129,-18.31) 15.621,-18.31 ; 15.621,-21.116 16.095,-20.895 ccw(c15.88,-20.434) 16.388,-20.434 16.388,-19.68 ccw(c15.88,-19.68) 16.171,-19.264 15.695,-18.93 cw(c16.129,-18.31) 15.621,-18.871 ; 15.621,-13.843 15.621,-6.467 ; 15.621,-3.689 15.621,-1.133
Mechanical 8:
  drawing of 178 lines, arcs and shapes, not listed
Mechanical 14:
  lines w0.1: -15.621,-21.39 -16.2,-21.12 cw(c-15.88,-20.434) -16.637,-20.434 -16.637,-19.68 cw(c-15.88,-19.68) -16.314,-19.06 -15.838,-18.726 ccw(c-16.129,-18.31) -15.621,-18.31 ; -15.621,-21.116 -16.095,-20.895 cw(c-15.88,-20.434) -16.388,-20.434 -16.388,-19.68 cw(c-15.88,-19.68) -16.171,-19.264 -15.695,-18.93 ccw(c-16.129,-18.31) -15.621,-18.871 ; -1.714,-21.712 -1.714,-13.965 1.714,-13.965 1.714,-21.712 ; -1.27,-13.965 -1.27,-21.509 1.27,-21.509 1.27,-13.965 ; 15.621,-21.39 16.2,-21.12 ccw(c15.88,-20.434) 16.637,-20.434 16.637,-19.68 ccw(c15.88,-19.68) 16.314,-19.06 15.838,-18.726 cw(c16.129,-18.31) 15.621,-18.31 ; 15.621,-21.116 16.095,-20.895 ccw(c15.88,-20.434) 16.388,-20.434 16.388,-19.68 ccw(c15.88,-19.68) 16.171,-19.264 15.695,-18.93 cw(c16.129,-18.31) 15.621,-18.871 ; -15.621,-21.712 15.621,-21.712 15.621,6.736 -15.621,6.736 -15.621,-21.712
3D body "TYCO_5569260-1.stp": height 26.29, standoff -4.06, extent -16.637,-21.712 16.637,6.736